# Altium footprint library ST封装.PcbLib: 1336 footprints (part 62 of 109)
Each footprint in its own frame and in the unit in brackets; x right, y up, seen from the top. Pads: shape width x height; smd on the part's side, far side on the other; paste and mask are expansions set on the pad; w line width, h text height; cw(c..) or ccw(c..) is an arc to the next point about the centre after c.
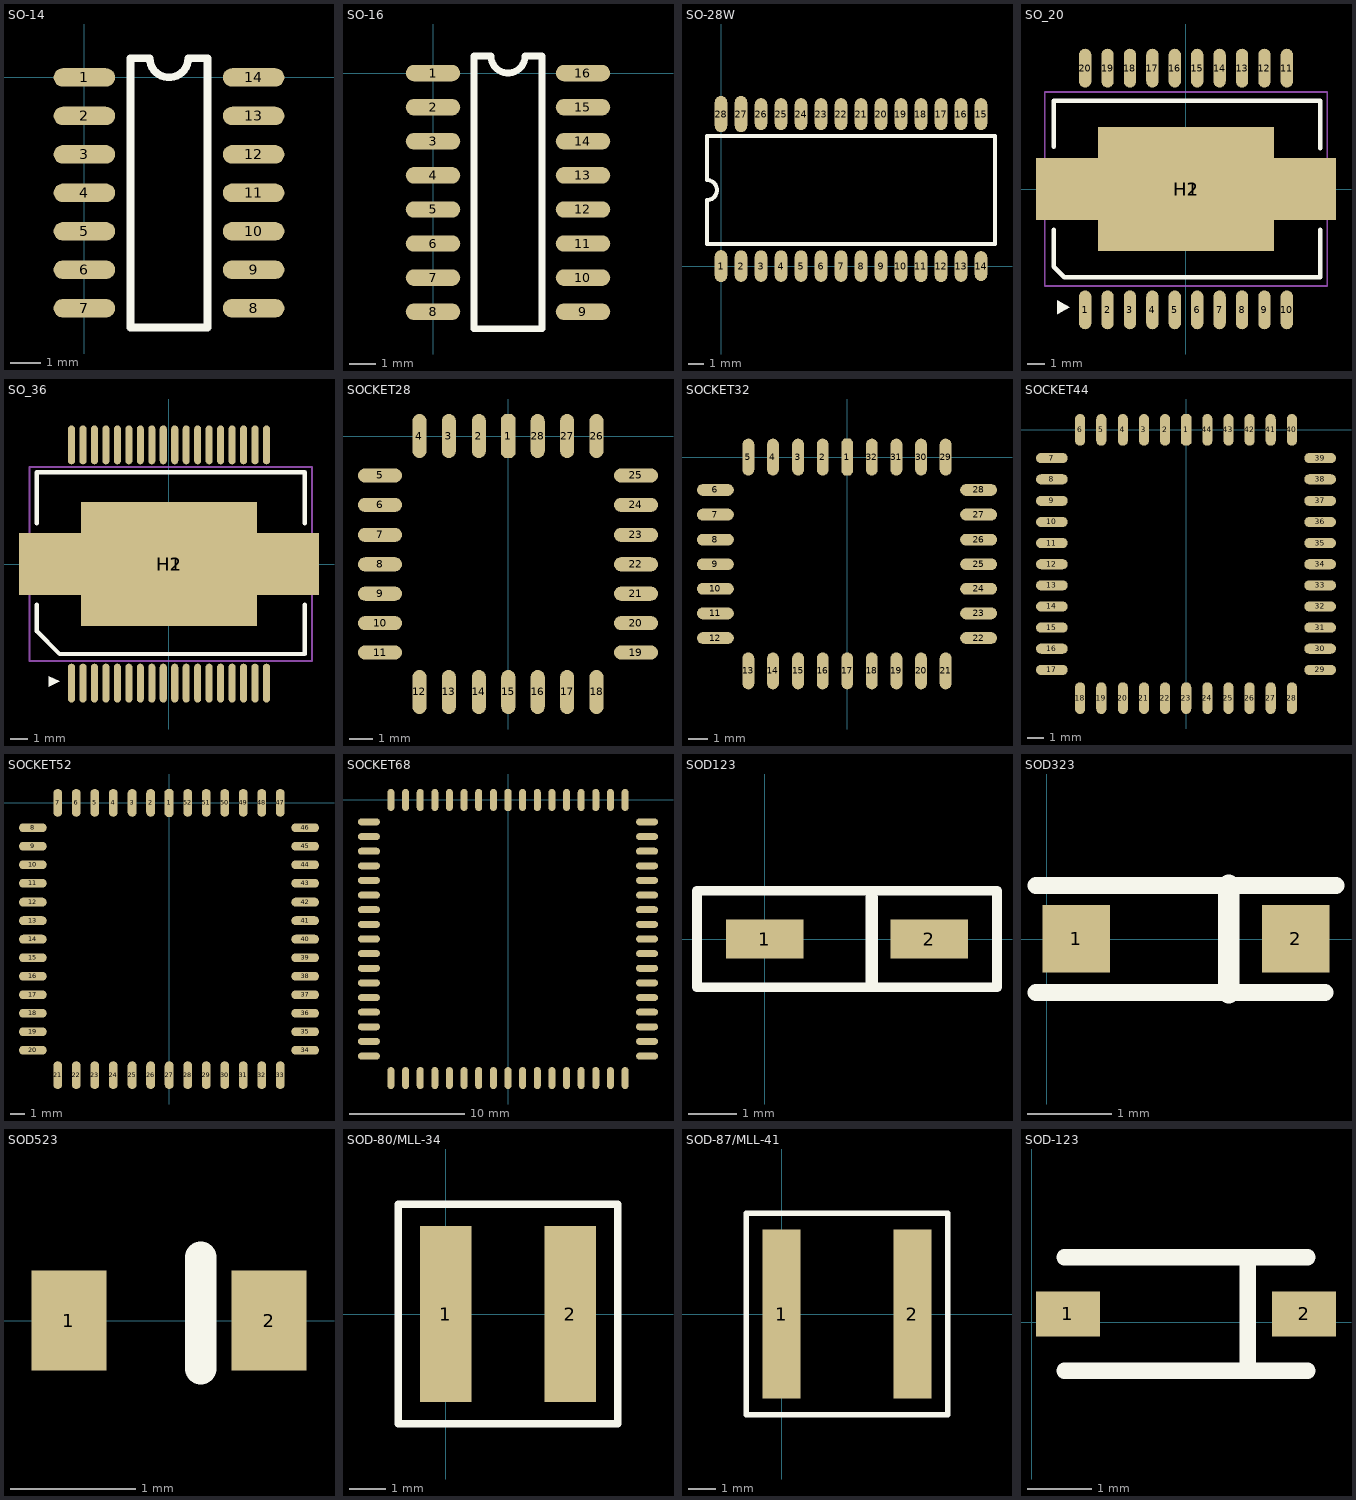
[diagram p61: the footprints below, top view; thin cyan lines are the x and y axes]

## SO-14 [mil]
pads (14):
  oval 80x24 smd: 1(0,0) 2(0,-50) 3(0,-100) 4(0,-150) 5(0,-200) 6(0,-250) 7(0,-300) 8(220,-300) 9(220,-250) 10(220,-200) 11(220,-150) 12(220,-100) 13(220,-50) 14(220,0)
Top Overlay:
  lines w10: 60,-325 60,25 85,25 ccw(c110,25) 135,25 160,25 160,-325 60,-325

## SO-16 [mil]
pads (16):
  oval 80x24 smd: 1(0,0) 2(0,-50) 3(0,-100) 4(0,-150) 5(0,-200) 6(0,-250) 7(0,-300) 8(0,-350) 9(220,-350) 10(220,-300) 11(220,-250) 12(220,-200) 13(220,-150) 14(220,-100) 15(220,-50) 16(220,0)
Top Overlay:
  lines w10: 60,-375 160,-375 160,25 135,25 cw(c110,25) 85,25 60,25 60,-375

## SO-28W [mm]
pads (28):
  oval 0.8x2.032 smd: 1(0,0) 11(12.7,0) 12(13.97,0) 15(16.51,9.652) 16(15.24,9.652) 17(13.97,9.652) 18(12.7,9.652) 19(11.43,9.652) 20(10.16,9.652) 21(8.89,9.652) 22(7.62,9.652) 23(6.35,9.652) 24(5.08,9.652) 25(3.81,9.652) 26(2.54,9.652)
  oval 0.8x2 smd: 2(1.27,0) 3(2.54,0) 4(3.81,0) 5(5.08,0) 6(6.35,0) 7(7.62,0) 8(8.89,0) 9(10.16,0) 10(11.43,0) 13(15.24,0)
  oval 0.8x1.9 smd: 14(16.51,0)
  oval 0.8x2.3 smd: 27(1.27,9.652) 28(0,9.652)
Top Overlay:
  lines w0.254: -0.889,1.397 17.399,1.397 17.399,8.255 -0.889,8.255 -0.889,5.461 cw(c-0.889,4.826) -0.889,4.191 -0.889,1.397

## SO_20 [mm]
pads (22):
  oval 0.7x2.2 smd: 1(-5.715,-6.85) 2(-4.445,-6.85) 3(-3.175,-6.85) 4(-1.905,-6.85) 5(-0.635,-6.85) 6(0.635,-6.85) 7(1.905,-6.85) 8(3.175,-6.85) 9(4.445,-6.85) 10(5.715,-6.85) 11(5.715,6.85) 12(4.445,6.85) 13(3.175,6.85) 14(1.905,6.85) 15(0.635,6.85) 16(-0.635,6.85) 17(-1.905,6.85) 18(-3.175,6.85) 19(-4.445,6.85) 20(-5.715,6.85)
  rect 17x3.5 smd: H1(0,0)
  rect 10x7 smd: H2(0,0)
Top Overlay:
  region: -6.6,-6.7 -7.3,-6.3 -7.3,-7.1
  lines w0.254: -7.5,-2.3 -7.5,-4.4 -6.9,-5 7.6,-5 7.6,-2.3 ; -7.5,2.4 -7.5,5 7.6,5 7.6,2.3
Mechanical 15:
  lines w0.1: -8,-5.5 -8,5.5 8,5.5 8,-5.5 -8,-5.5
3D body "SO-20.STEP": height 3.6, standoff 0, extent -8,-7.2 8,7.2

## SO_36 [mm]
pads (38):
  oval 0.4x2.2 smd mask+0.051: 1(-5.525,-6.75) 2(-4.875,-6.75) 3(-4.225,-6.75) 4(-3.575,-6.75) 5(-2.925,-6.75) 6(-2.275,-6.75) 7(-1.625,-6.75) 8(-0.975,-6.75) 9(-0.325,-6.75) 10(0.325,-6.75) 11(0.975,-6.75) 12(1.625,-6.75) 13(2.275,-6.75) 14(2.925,-6.75) 15(3.575,-6.75) 16(4.225,-6.75) 17(4.875,-6.75) 18(5.525,-6.75) 19(5.525,6.75) 20(4.875,6.75) 21(4.225,6.75) 22(3.575,6.75) 23(2.925,6.75) 24(2.275,6.75) 25(1.625,6.75) 26(0.975,6.75) 27(0.325,6.75) 28(-0.325,6.75) 29(-0.975,6.75) 30(-1.625,6.75) 31(-2.275,6.75) 32(-2.925,6.75) 33(-3.575,6.75) 34(-4.225,6.75) 35(-4.875,6.75) 36(-5.525,6.75)
  rect 17x3.5 smd: H1(0,0)
  rect 10x7 smd: H2(0,0)
Top Overlay:
  region: -6.2,-6.65 -6.8,-6.35 -6.8,-6.95
  lines w0.254: -7.5,-2.3 -7.5,-3.8 -6.2,-5.1 7.7,-5.1 7.7,-2.3 ; -7.5,2.3 -7.5,5.2 7.7,5.2 7.7,2.3
Mechanical 15:
  lines w0.1: -7.9,-5.5 -7.9,5.5 8.1,5.5 8.1,-5.5 -7.9,-5.5
3D body "SO-36.STEP": height 3.5, standoff 0, extent -7.835,-7.1 8.115,7.1

## SOCKET28 [mil]
pads (28):
  oct 24x75 smd: 1(0,0)
  oval 24x75 smd: 2(-50,0) 3(-101,0) 4(-151,0) 12(-151,-435) 13(-101,-435) 14(-50,-435) 15(0,-435) 16(50,-435) 17(100,-435) 18(150,-435) 26(150,0) 27(100,0) 28(50,0)
  oval 75x24 smd: 5(-218,-67) 6(-218,-117) 7(-218,-168) 8(-218,-218) 9(-218,-268) 10(-218,-318) 11(-218,-368) 19(217,-368) 20(217,-318) 21(217,-268) 22(217,-218) 23(217,-168) 24(217,-117) 25(217,-67)

## SOCKET32 [mil]
pads (32):
  oct 24x75 smd: 1(0,0)
  oval 24x75 smd: 2(-50,0) 3(-100,0) 4(-151,0) 5(-201,0) 13(-201,-435) 14(-151,-435) 15(-100,-435) 16(-50,-435) 17(0,-435) 18(50,-435) 19(100,-435) 20(150,-435) 21(200,-435) 29(200,0) 30(150,0) 31(100,0) 32(50,0)
  oval 75x24 smd: 6(-268,-67) 7(-268,-117) 8(-268,-168) 9(-268,-218) 10(-268,-268) 11(-268,-318) 12(-268,-368) 22(267,-368) 23(267,-318) 24(267,-268) 25(267,-218) 26(267,-168) 27(267,-117) 28(267,-67)

## SOCKET44 [mil]
pads (44):
  oct 24x75 smd: 1(0,0)
  oval 24x75 smd: 2(-50,0) 3(-100,0) 4(-150,0) 5(-201,0) 6(-251,0) 18(-251,-635) 19(-201,-635) 20(-150,-635) 21(-100,-635) 22(-50,-635) 23(0,-635) 24(50,-635) 25(100,-635) 26(150,-635) 27(200,-635) 28(250,-635) 40(250,0) 41(200,0) 42(150,0) 43(100,0) 44(50,0)
  oval 75x24 smd: 7(-318,-67) 8(-318,-117) 9(-318,-168) 10(-318,-218) 11(-318,-268) 12(-318,-318) 13(-318,-368) 14(-318,-418) 15(-318,-468) 16(-318,-518) 17(-318,-568) 29(317,-568) 30(317,-518) 31(317,-468) 32(317,-418) 33(317,-368) 34(317,-318) 35(317,-268) 36(317,-218) 37(317,-168) 38(317,-117) 39(317,-67)

## SOCKET52 [mil]
pads (52):
  oct 24x75 smd: 1(0,0)
  oval 24x75 smd: 2(-50,0) 3(-100,0) 4(-151,0) 5(-201,0) 6(-251,0) 7(-301,0) 21(-301,-735) 22(-251,-735) 23(-201,-735) 24(-151,-735) 25(-100,-735) 26(-50,-735) 27(0,-735) 28(50,-735) 29(100,-735) 30(150,-735) 31(200,-735) 32(250,-735) 33(300,-735) 47(300,0) 48(250,0) 49(200,0) 50(150,0) 51(100,0) 52(50,0)
  oval 75x24 smd: 8(-368,-67) 9(-368,-117) 10(-368,-167) 11(-368,-217) 12(-368,-268) 13(-368,-318) 14(-368,-368) 15(-368,-418) 16(-368,-468) 17(-368,-518) 18(-368,-568) 19(-368,-618) 20(-368,-668) 34(367,-668) 35(367,-618) 36(367,-568) 37(367,-518) 38(367,-468) 39(367,-418) 40(367,-368) 41(367,-318) 42(367,-268) 43(367,-217) 44(367,-167) 45(367,-117) 46(367,-67)

## SOCKET68 [mil]
pads (68):
  oct 24x75 smd: 1(0,0)
  oval 24x75 smd: 2(-50,0) 3(-100,0) 4(-150,0) 5(-200,0) 6(-250,0) 7(-300,0) 8(-350,0) 9(-400,0) 27(-400,-950) 28(-350,-950) 29(-300,-950) 30(-250,-950) 31(-200,-950) 32(-150,-950) 33(-100,-950) 34(-50,-950) 35(0,-950) 36(50,-950) 37(100,-950) 38(150,-950) 39(200,-950) 40(250,-950) 41(300,-950) 42(350,-950) 43(400,-950) 61(400,0) 62(350,0) 63(300,0) 64(250,0) 65(200,0) 66(150,0) 67(100,0) 68(50,0)
  oval 75x24 smd: 10(-475,-75) 11(-475,-125) 12(-475,-175) 13(-475,-225) 14(-475,-275) 15(-475,-325) 16(-475,-375) 17(-475,-425) 18(-475,-475) 19(-475,-525) 20(-475,-575) 21(-475,-625) 22(-475,-675) 23(-475,-725) 24(-475,-775) 25(-475,-825) 26(-475,-875) 44(475,-875) 45(475,-825) 46(475,-775) 47(475,-725) 48(475,-675) 49(475,-625) 50(475,-575) 51(475,-525) 52(475,-475) 53(475,-425) 54(475,-375) 55(475,-325) 56(475,-275) 57(475,-225) 58(475,-175) 59(475,-125) 60(475,-75)

## SOD123 [mm]
pads (2):
  rect 1.6x0.8 smd: 1(0,0) 2(3.4,0)
Top Overlay:
  lines w0.2: -1.4,-1 -1.4,1 4.8,1 4.8,-1 -1.4,-1
  lines w0.254: 2.214,-0.927 2.214,0.851
3D body "SOD-123.STEP": height 1.2, standoff 0, extent -0.072,-0.8 3.628,0.8

## SOD323 [mm]
pads (2):
  rect 0.8x0.8 smd: 1(0.351,0) 2(2.951,0)
Top Overlay:
  lines w0.2: -0.127,-0.635 3.302,-0.635 ; -0.127,0.635 3.429,0.635
  lines w0.254: 2.159,-0.635 2.159,0.635
3D body "SOD-323.STEP": height 1, standoff 0, extent 0.351,-0.65 2.951,0.65

## SOD523 [mm]
pads (2):
  rect 0.6x0.8 smd: 1(0.851,0) 2(2.451,0)
Top Overlay:
  lines w0.254: 1.905,-0.381 1.905,0.508
3D body "SOD-523.STEP": height 0.65, standoff 0, extent 0.851,-0.4 2.451,0.4

## SOD-80/MLL-34 [mm]
pads (2):
  rect 1.4x4.8 smd: 1(0,0) 2(3.4,0)
Top Overlay:
  lines w0.2: -1.3,-3 -1.3,3 4.7,3 4.7,-3 -1.3,-3

## SOD-87/MLL-41 [mm]
pads (2):
  rect 1.4x6.2 smd: 1(0,0) 2(4.8,0)
Top Overlay:
  lines w0.2: -1.3,-3.7 -1.3,3.7 6.1,3.7 6.1,-3.7 -1.3,-3.7

## SOD-123 [mm]
pads (2):
  rect 1x0.7 smd: 1(0.563,0.127) 2(4.263,0.127)
Top Overlay:
  lines w0.254: 0.508,-0.762 4.318,-0.762 ; 0.508,1.016 4.318,1.016 ; 3.381,-0.762 3.381,1.016
3D body "SOD-123.STEP": height 1.2, standoff 0, extent 0.563,-0.673 4.263,0.927